# Altium footprint library MiscDevices.PcbLib: 251 footprints (part 10 of 16)
Each footprint in its own frame and in the unit in brackets; x right, y up, seen from the top. Pads: shape width x height; smd on the part's side, far side on the other; paste and mask are expansions set on the pad; w line width, h text height; cw(c..) or ccw(c..) is an arc to the next point about the centre after c.
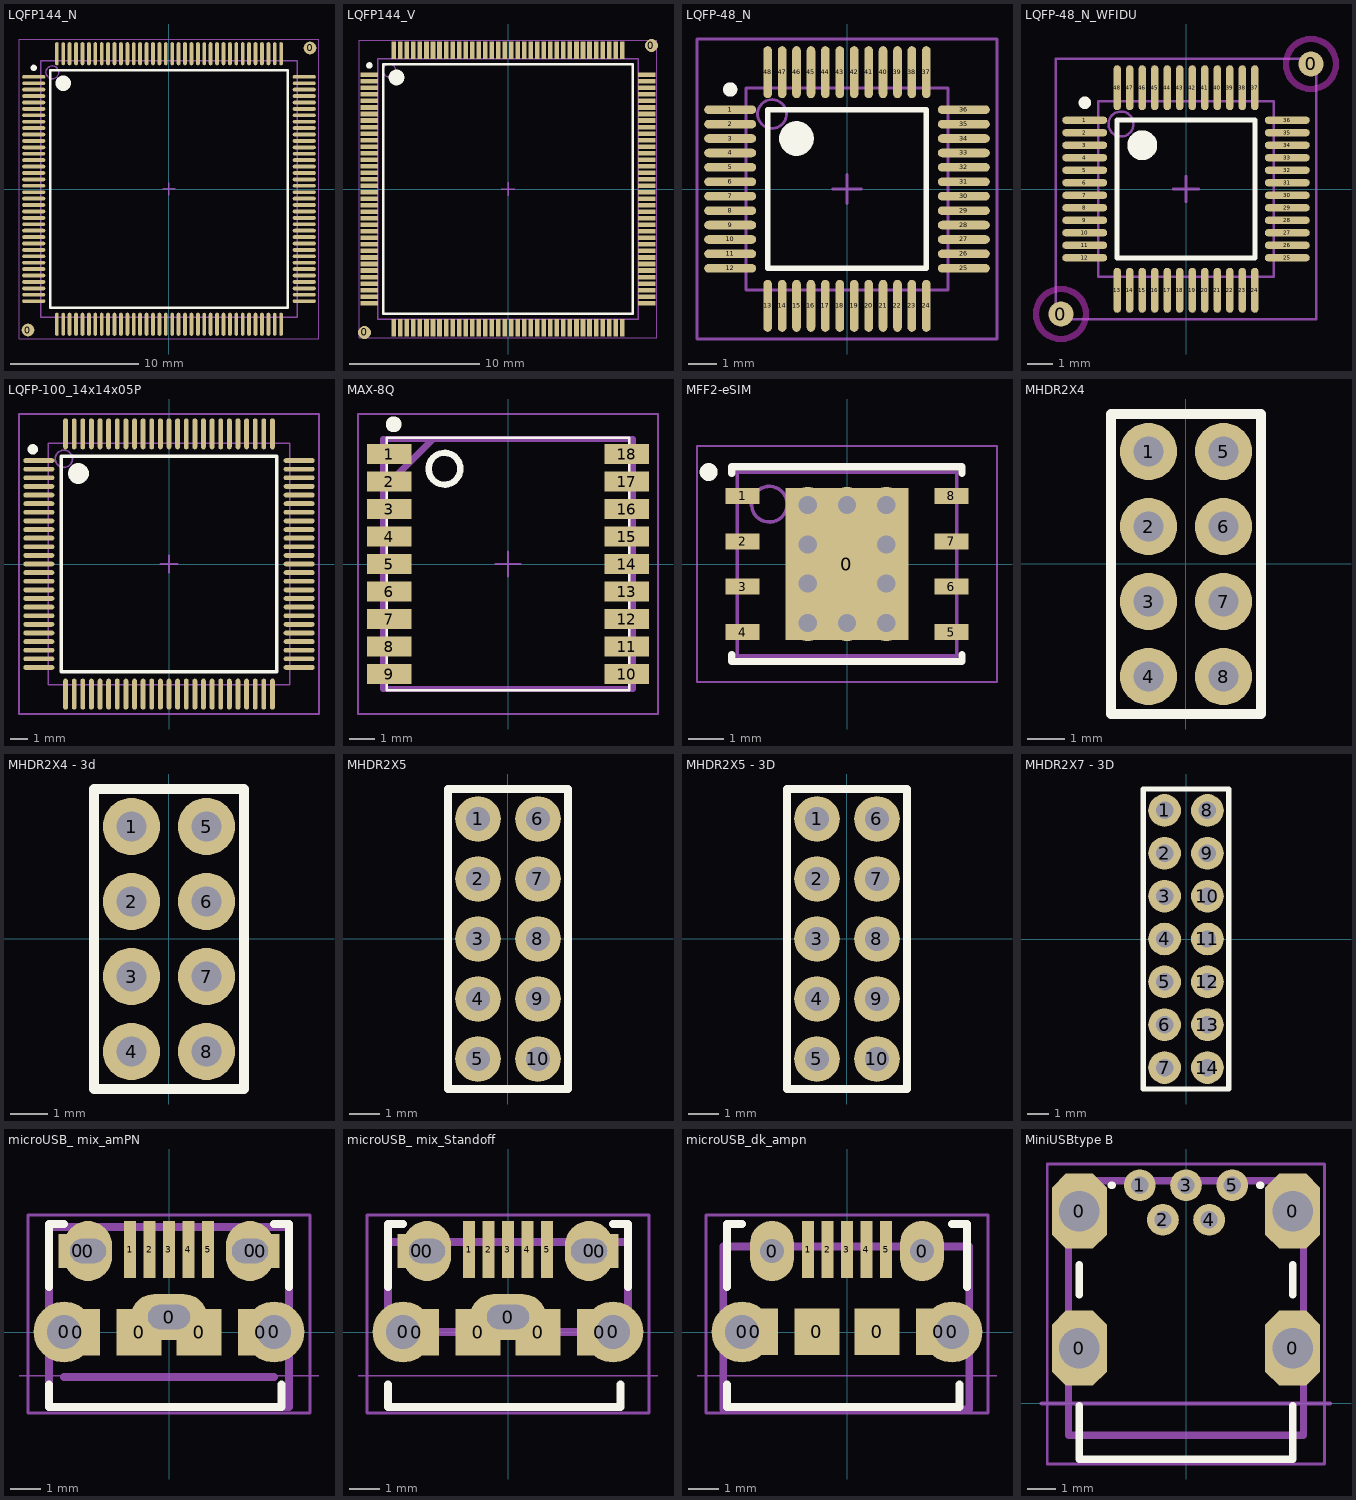
[diagram p9: the footprints below, top view; thin cyan lines are the x and y axes]

## LQFP144_N [mm] "Thin QFP, 144-Leads, Body 20x20mm, Pitch 0.5mm, IPC Medium Density"
height 1.6
pads (146):
  round 1 smd paste-10 mask+1: 0(-11,-11) 0(11,11)
  oval 1.8x0.3 smd: 1(-10.55,8.75) 2(-10.55,8.25) 3(-10.55,7.75) 4(-10.55,7.25) 5(-10.55,6.75) 6(-10.55,6.25) 7(-10.55,5.75) 8(-10.55,5.25) 9(-10.55,4.75) 10(-10.55,4.25) 11(-10.55,3.75) 12(-10.55,3.25) 13(-10.55,2.75) 14(-10.55,2.25) 15(-10.55,1.75) 16(-10.55,1.25) 17(-10.55,0.75) 18(-10.55,0.25) 19(-10.55,-0.25) 20(-10.55,-0.75) 21(-10.55,-1.25) 22(-10.55,-1.75) 23(-10.55,-2.25) 24(-10.55,-2.75) 25(-10.55,-3.25) 26(-10.55,-3.75) 27(-10.55,-4.25) 28(-10.55,-4.75) 29(-10.55,-5.25) 30(-10.55,-5.75) 31(-10.55,-6.25) 32(-10.55,-6.75) 33(-10.55,-7.25) 34(-10.55,-7.75) 35(-10.55,-8.25) 36(-10.55,-8.75) 73(10.55,-8.75) 74(10.55,-8.25) 75(10.55,-7.75) 76(10.55,-7.25) 77(10.55,-6.75) 78(10.55,-6.25) 79(10.55,-5.75) 80(10.55,-5.25) 81(10.55,-4.75) 82(10.55,-4.25) 83(10.55,-3.75) 84(10.55,-3.25) 85(10.55,-2.75) 86(10.55,-2.25) 87(10.55,-1.75) 88(10.55,-1.25) 89(10.55,-0.75) 90(10.55,-0.25) 91(10.55,0.25) 92(10.55,0.75) 93(10.55,1.25) 94(10.55,1.75) 95(10.55,2.25) 96(10.55,2.75) 97(10.55,3.25) 98(10.55,3.75) 99(10.55,4.25) 100(10.55,4.75) 101(10.55,5.25) 102(10.55,5.75) 103(10.55,6.25) 104(10.55,6.75) 105(10.55,7.25) 106(10.55,7.75) 107(10.55,8.25) 108(10.55,8.75)
  oval 0.3x1.8 smd: 37(-8.75,-10.55) 38(-8.25,-10.55) 39(-7.75,-10.55) 40(-7.25,-10.55) 41(-6.75,-10.55) 42(-6.25,-10.55) 43(-5.75,-10.55) 44(-5.25,-10.55) 45(-4.75,-10.55) 46(-4.25,-10.55) 47(-3.75,-10.55) 48(-3.25,-10.55) 49(-2.75,-10.55) 50(-2.25,-10.55) 51(-1.75,-10.55) 52(-1.25,-10.55) 53(-0.75,-10.55) 54(-0.25,-10.55) 55(0.25,-10.55) 56(0.75,-10.55) 57(1.25,-10.55) 58(1.75,-10.55) 59(2.25,-10.55) 60(2.75,-10.55) 61(3.25,-10.55) 62(3.75,-10.55) 63(4.25,-10.55) 64(4.75,-10.55) 65(5.25,-10.55) 66(5.75,-10.55) 67(6.25,-10.55) 68(6.75,-10.55) 69(7.25,-10.55) 70(7.75,-10.55) 71(8.25,-10.55) 72(8.75,-10.55) 109(8.75,10.55) 110(8.25,10.55) 111(7.75,10.55) 112(7.25,10.55) 113(6.75,10.55) 114(6.25,10.55) 115(5.75,10.55) 116(5.25,10.55) 117(4.75,10.55) 118(4.25,10.55) 119(3.75,10.55) 120(3.25,10.55) 121(2.75,10.55) 122(2.25,10.55) 123(1.75,10.55) 124(1.25,10.55) 125(0.75,10.55) 126(0.25,10.55) 127(-0.25,10.55) 128(-0.75,10.55) 129(-1.25,10.55) 130(-1.75,10.55) 131(-2.25,10.55) 132(-2.75,10.55) 133(-3.25,10.55) 134(-3.75,10.55) 135(-4.25,10.55) 136(-4.75,10.55) 137(-5.25,10.55) 138(-5.75,10.55) 139(-6.25,10.55) 140(-6.75,10.55) 141(-7.25,10.55) 142(-7.75,10.55) 143(-8.25,10.55) 144(-8.75,10.55)
Top Overlay:
  circle w0.6: c-8.25,8.25 r0.3
  circle w0.25: c-10.55,9.45 r0.125
  lines w0.2: -9.25,-9.25 9.25,-9.25 9.25,9.25 -9.25,9.25 -9.25,-9.25
Top Designator (Mech7):
  text ".Designator" at -7.618,-0.508 h1.52
Top Assembly:
  circle w0.1: c-9.1,9.1 r0.5
  lines w0.1: -10,-10 10,-10 10,10 -10,10 -10,-10
Top Courtyard:
  lines w0.05: -11.7,-11.7 11.7,-11.7 11.7,11.7 -11.7,11.7 -11.7,-11.7
  lines w0.1: -0.5,0 0.5,0 ; 0,-0.5 0,0.5
3D body "LQFP144-0_5.STEP": height 1.58, standoff 0.01, extent -10.886,-10.886 10.886,10.886

## LQFP144_V [mm] "Thin QFP, 144-Leads, Body 20x20mm, Pitch 0.5mm, ST Recommended"
height 1.6
pads (146):
  round 1 smd paste-10 mask+1: 0(-11,-11) 0(11,11)
  rect 1.35x0.35 smd: 1(-10.625,8.75) 2(-10.625,8.25) 3(-10.625,7.75) 4(-10.625,7.25) 5(-10.625,6.75) 6(-10.625,6.25) 7(-10.625,5.75) 8(-10.625,5.25) 9(-10.625,4.75) 10(-10.625,4.25) 11(-10.625,3.75) 12(-10.625,3.25) 13(-10.625,2.75) 14(-10.625,2.25) 15(-10.625,1.75) 16(-10.625,1.25) 17(-10.625,0.75) 18(-10.625,0.25) 19(-10.625,-0.25) 20(-10.625,-0.75) 21(-10.625,-1.25) 22(-10.625,-1.75) 23(-10.625,-2.25) 24(-10.625,-2.75) 25(-10.625,-3.25) 26(-10.625,-3.75) 27(-10.625,-4.25) 28(-10.625,-4.75) 29(-10.625,-5.25) 30(-10.625,-5.75) 31(-10.625,-6.25) 32(-10.625,-6.75) 33(-10.625,-7.25) 34(-10.625,-7.75) 35(-10.625,-8.25) 36(-10.625,-8.75) 73(10.625,-8.75) 74(10.625,-8.25) 75(10.625,-7.75) 76(10.625,-7.25) 77(10.625,-6.75) 78(10.625,-6.25) 79(10.625,-5.75) 80(10.625,-5.25) 81(10.625,-4.75) 82(10.625,-4.25) 83(10.625,-3.75) 84(10.625,-3.25) 85(10.625,-2.75) 86(10.625,-2.25) 87(10.625,-1.75) 88(10.625,-1.25) 89(10.625,-0.75) 90(10.625,-0.25) 91(10.625,0.25) 92(10.625,0.75) 93(10.625,1.25) 94(10.625,1.75) 95(10.625,2.25) 96(10.625,2.75) 97(10.625,3.25) 98(10.625,3.75) 99(10.625,4.25) 100(10.625,4.75) 101(10.625,5.25) 102(10.625,5.75) 103(10.625,6.25) 104(10.625,6.75) 105(10.625,7.25) 106(10.625,7.75) 107(10.625,8.25) 108(10.625,8.75)
  rect 0.35x1.35 smd: 37(-8.75,-10.625) 38(-8.25,-10.625) 39(-7.75,-10.625) 40(-7.25,-10.625) 41(-6.75,-10.625) 42(-6.25,-10.625) 43(-5.75,-10.625) 44(-5.25,-10.625) 45(-4.75,-10.625) 46(-4.25,-10.625) 47(-3.75,-10.625) 48(-3.25,-10.625) 49(-2.75,-10.625) 50(-2.25,-10.625) 51(-1.75,-10.625) 52(-1.25,-10.625) 53(-0.75,-10.625) 54(-0.25,-10.625) 55(0.25,-10.625) 56(0.75,-10.625) 57(1.25,-10.625) 58(1.75,-10.625) 59(2.25,-10.625) 60(2.75,-10.625) 61(3.25,-10.625) 62(3.75,-10.625) 63(4.25,-10.625) 64(4.75,-10.625) 65(5.25,-10.625) 66(5.75,-10.625) 67(6.25,-10.625) 68(6.75,-10.625) 69(7.25,-10.625) 70(7.75,-10.625) 71(8.25,-10.625) 72(8.75,-10.625) 109(8.75,10.625) 110(8.25,10.625) 111(7.75,10.625) 112(7.25,10.625) 113(6.75,10.625) 114(6.25,10.625) 115(5.75,10.625) 116(5.25,10.625) 117(4.75,10.625) 118(4.25,10.625) 119(3.75,10.625) 120(3.25,10.625) 121(2.75,10.625) 122(2.25,10.625) 123(1.75,10.625) 124(1.25,10.625) 125(0.75,10.625) 126(0.25,10.625) 127(-0.25,10.625) 128(-0.75,10.625) 129(-1.25,10.625) 130(-1.75,10.625) 131(-2.25,10.625) 132(-2.75,10.625) 133(-3.25,10.625) 134(-3.75,10.625) 135(-4.25,10.625) 136(-4.75,10.625) 137(-5.25,10.625) 138(-5.75,10.625) 139(-6.25,10.625) 140(-6.75,10.625) 141(-7.25,10.625) 142(-7.75,10.625) 143(-8.25,10.625) 144(-8.75,10.625)
Top Overlay:
  circle w0.25: c-10.625,9.475 r0.125
  circle w0.6: c-8.55,8.55 r0.3
  lines w0.2: -9.55,-9.55 -9.55,9.55 9.55,9.55 9.55,-9.55 -9.55,-9.55
Top Designator (Mech7):
  text ".Designator" at -7.618,-0.508 h1.52
Top Assembly:
  circle w0.1: c-9.1,9.1 r0.5
  lines w0.1: -10,-10 -10,10 10,10 10,-10 -10,-10
Top Courtyard:
  lines w0.05: -11.4,-11.4 -11.4,11.4 11.4,11.4 11.4,-11.4 -11.4,-11.4
  lines w0.1: -0.5,0 0.5,0 ; 0,-0.5 0,0.5
3D body "LQFP144-0_5.STEP": height 1.58, standoff 0.01, extent -10.886,-10.886 10.886,10.886

## LQFP-48_N [mm] "Thin QFP, 48-Leads, Body 7x7mm, Pitch 0.5mm, IPC Medium Density"
height 1.6
pads (48):
  oval 1.8x0.3 smd: 1(-4.05,2.75) 2(-4.05,2.25) 3(-4.05,1.75) 4(-4.05,1.25) 5(-4.05,0.75) 6(-4.05,0.25) 7(-4.05,-0.25) 8(-4.05,-0.75) 9(-4.05,-1.25) 10(-4.05,-1.75) 11(-4.05,-2.25) 12(-4.05,-2.75) 25(4.05,-2.75) 26(4.05,-2.25) 27(4.05,-1.75) 28(4.05,-1.25) 29(4.05,-0.75) 30(4.05,-0.25) 31(4.05,0.25) 32(4.05,0.75) 33(4.05,1.25) 34(4.05,1.75) 35(4.05,2.25) 36(4.05,2.75)
  oval 0.3x1.8 smd: 13(-2.75,-4.05) 14(-2.25,-4.05) 15(-1.75,-4.05) 16(-1.25,-4.05) 17(-0.75,-4.05) 18(-0.25,-4.05) 19(0.25,-4.05) 20(0.75,-4.05) 21(1.25,-4.05) 22(1.75,-4.05) 23(2.25,-4.05) 24(2.75,-4.05) 37(2.75,4.05) 38(2.25,4.05) 39(1.75,4.05) 40(1.25,4.05) 41(0.75,4.05) 42(0.25,4.05) 43(-0.25,4.05) 44(-0.75,4.05) 45(-1.25,4.05) 46(-1.75,4.05) 47(-2.25,4.05) 48(-2.75,4.05)
Top Overlay:
  circle w0.6: c-1.75,1.75 r0.3
  circle w0.25: c-4.05,3.45 r0.125
  lines w0.2: -2.75,-2.75 2.75,-2.75 2.75,2.75 -2.75,2.75 -2.75,-2.75
Top Designator (Mech7):
  text ".Designator" at -7.618,-0.508 h1.52
Top Assembly:
  circle w0.1: c-2.6,2.6 r0.5
  lines w0.1: -3.5,-3.5 3.5,-3.5 3.5,3.5 -3.5,3.5 -3.5,-3.5
Top Courtyard:
  lines w0.1: -0.5,0 0.5,0 ; 0,-0.5 0,0.5 ; -5.2,-5.2 5.2,-5.2 5.2,5.2 -5.2,5.2 -5.2,-5.2
3D body "SW3dPS-P-LQFP48-7x7-0.50.STEP": height 1.46, standoff 0.01, extent -4.5,-4.5 4.5,4.5

## LQFP-48_N_WFIDU [mm] "Thin QFP, 48-Leads, Body 7x7mm, Pitch 0.5mm, IPC Medium Density"
height 1.6
pads (50):
  round 1 smd paste-10 mask+0.5: 0(-5,-5) 0(5,5)
  oval 1.8x0.3 smd: 1(-4.05,2.75) 2(-4.05,2.25) 3(-4.05,1.75) 4(-4.05,1.25) 5(-4.05,0.75) 6(-4.05,0.25) 7(-4.05,-0.25) 8(-4.05,-0.75) 9(-4.05,-1.25) 10(-4.05,-1.75) 11(-4.05,-2.25) 12(-4.05,-2.75) 25(4.05,-2.75) 26(4.05,-2.25) 27(4.05,-1.75) 28(4.05,-1.25) 29(4.05,-0.75) 30(4.05,-0.25) 31(4.05,0.25) 32(4.05,0.75) 33(4.05,1.25) 34(4.05,1.75) 35(4.05,2.25) 36(4.05,2.75)
  oval 0.3x1.8 smd: 13(-2.75,-4.05) 14(-2.25,-4.05) 15(-1.75,-4.05) 16(-1.25,-4.05) 17(-0.75,-4.05) 18(-0.25,-4.05) 19(0.25,-4.05) 20(0.75,-4.05) 21(1.25,-4.05) 22(1.75,-4.05) 23(2.25,-4.05) 24(2.75,-4.05) 37(2.75,4.05) 38(2.25,4.05) 39(1.75,4.05) 40(1.25,4.05) 41(0.75,4.05) 42(0.25,4.05) 43(-0.25,4.05) 44(-0.75,4.05) 45(-1.25,4.05) 46(-1.75,4.05) 47(-2.25,4.05) 48(-2.75,4.05)
Top Layer keep-out:
  lines w0.254: -4,-5 ccw(c-5,-5) -4,-5 ; 6,5 ccw(c5,5) 6,5
Top Overlay:
  circle w0.6: c-1.75,1.75 r0.3
  circle w0.25: c-4.05,3.45 r0.125
  lines w0.2: -2.75,-2.75 2.75,-2.75 2.75,2.75 -2.75,2.75 -2.75,-2.75
Top Designator (Mech7):
  text ".Designator" at -7.618,-0.508 h1.52
Top Assembly:
  circle w0.1: c-2.6,2.6 r0.5
  lines w0.1: -3.5,-3.5 3.5,-3.5 3.5,3.5 -3.5,3.5 -3.5,-3.5
Top Courtyard:
  lines w0.1: -0.5,0 0.5,0 ; 0,-0.5 0,0.5 ; -5.2,-5.2 5.2,-5.2 5.2,5.2 -5.2,5.2 -5.2,-5.2
3D body "SW3dPS-P-LQFP48-7x7-0.50.STEP": height 1.46, standoff 0.01, extent -4.5,-4.5 4.5,4.5

## LQFP-100_14x14x05P [mm]
pads (100):
  oval 1.8x0.28 smd mask+0.051: 1(-7.55,6) 2(-7.55,5.5) 3(-7.55,5) 4(-7.55,4.5) 5(-7.55,4) 6(-7.55,3.5) 7(-7.55,3) 8(-7.55,2.5) 9(-7.55,2) 10(-7.55,1.5) 11(-7.55,1) 12(-7.55,0.5) 13(-7.55,0) 14(-7.55,-0.5) 15(-7.55,-1) 16(-7.55,-1.5) 17(-7.55,-2) 18(-7.55,-2.5) 19(-7.55,-3) 20(-7.55,-3.5) 21(-7.55,-4) 22(-7.55,-4.5) 23(-7.55,-5) 24(-7.55,-5.5) 25(-7.55,-6) 51(7.55,-6) 52(7.55,-5.5) 53(7.55,-5) 54(7.55,-4.5) 55(7.55,-4) 56(7.55,-3.5) 57(7.55,-3) 58(7.55,-2.5) 59(7.55,-2) 60(7.55,-1.5) 61(7.55,-1) 62(7.55,-0.5) 63(7.55,0) 64(7.55,0.5) 65(7.55,1) 66(7.55,1.5) 67(7.55,2) 68(7.55,2.5) 69(7.55,3) 70(7.55,3.5) 71(7.55,4) 72(7.55,4.5) 73(7.55,5) 74(7.55,5.5) 75(7.55,6)
  oval 0.28x1.8 smd mask+0.051: 26(-6,-7.55) 27(-5.5,-7.55) 28(-5,-7.55) 29(-4.5,-7.55) 30(-4,-7.55) 31(-3.5,-7.55) 32(-3,-7.55) 33(-2.5,-7.55) 34(-2,-7.55) 35(-1.5,-7.55) 36(-1,-7.55) 37(-0.5,-7.55) 38(0,-7.55) 39(0.5,-7.55) 40(1,-7.55) 41(1.5,-7.55) 42(2,-7.55) 43(2.5,-7.55) 44(3,-7.55) 45(3.5,-7.55) 46(4,-7.55) 47(4.5,-7.55) 48(5,-7.55) 49(5.5,-7.55) 50(6,-7.55) 76(6,7.55) 77(5.5,7.55) 78(5,7.55) 79(4.5,7.55) 80(4,7.55) 81(3.5,7.55) 82(3,7.55) 83(2.5,7.55) 84(2,7.55) 85(1.5,7.55) 86(1,7.55) 87(0.5,7.55) 88(0,7.55) 89(-0.5,7.55) 90(-1,7.55) 91(-1.5,7.55) 92(-2,7.55) 93(-2.5,7.55) 94(-3,7.55) 95(-3.5,7.55) 96(-4,7.55) 97(-4.5,7.55) 98(-5,7.55) 99(-5.5,7.55) 100(-6,7.55)
Top Overlay:
  circle w0.3: c-7.9,6.65 r0.15
  circle w0.6: c-5.25,5.25 r0.3
  lines w0.2: -6.25,-6.25 -6.25,6.25 6.25,6.25 6.25,-6.25 -6.25,-6.25
Top Designator (Mech7):
  text ".Designator" at -7.618,-0.508 h1.52
Top Assembly:
  circle w0.1: c-6.1,6.1 r0.5
  lines w0.1: -7,-7 -7,7 7,7 7,-7 -7,-7
Top Courtyard:
  lines w0.1: -0.5,0 0.5,0 ; 0,-0.5 0,0.5 ; -8.7,-8.7 8.7,-8.7 8.7,8.7 -8.7,8.7 -8.7,-8.7
3D body "LQFP-100.STEP": height 1.6, standoff 0, extent -8,-8 8,8

## MAX-8Q [mm] "MAX-8Q U-Blox GNSS"
pads (18):
  rect 1.8x0.8 smd: 1(-4.75,4.4) 2(-4.75,3.3) 3(-4.75,2.2) 4(-4.75,1.1) 5(-4.75,0) 6(-4.75,-1.1) 7(-4.75,-2.2) 8(-4.75,-3.3) 9(-4.75,-4.4) 10(4.75,-4.4) 11(4.75,-3.3) 12(4.75,-2.2) 13(4.75,-1.1) 14(4.75,0) 15(4.75,1.1) 16(4.75,2.2) 17(4.75,3.3) 18(4.75,4.4)
Top Overlay:
  circle w0.381: c-4.572,5.588 r0.127
  circle w0.254: c-2.54,3.81 r0.635
  lines w0.1: -4.85,-5.05 -4.85,5.05 4.85,5.05 4.85,-5.05 -4.85,-5.05
Top Designator (Mech7):
  text ".Designator" at -7.618,-0.508 h1.52
Top Assembly:
  lines w0.254: -5,3 -3,5 ; -5,-5 5,-5 5,5 -5,5 -5,-5
Top Courtyard:
  lines w0.1: -0.5,0 0.5,0 ; 0,-0.5 0,0.5 ; -6,-6 6,-6 6,6 -6,6 -6,-6
3D body "MAX (STEP-AP214).STEP": height 2.47, standoff 0, extent -4.85,-5.05 4.85,5.05

## MFF2-eSIM [mm] "QFN, 8-Leads, Body 6.08x5.08mm, Pitch 1.27mm, Thermal Pad 3.45x4.25mm, IPC Medium Density"
height 0.9
pads (17):
  rect 3.45x4.25 smd: 0(0,0)
  rect 0.95x0.45 smd: 1(-2.925,1.905) 2(-2.925,0.635) 3(-2.925,-0.635) 4(-2.925,-1.905) 5(2.925,-1.905) 6(2.925,-0.635) 7(2.925,0.635) 8(2.925,1.905)
  rect 0x0 smd: 9(-0.85,0) 10(-0.35,0) 11(0,0.85) 12(0,0.35) 13(0.85,0) 14(0.35,0) 15(0,-0.85) 16(0,-0.35)
via -1.1,1.65 diameter 1.016 hole 0.508
via 0,1.65 diameter 1.016 hole 0.508
via 1.1,1.65 diameter 1.016 hole 0.508
via -1.1,0.55 diameter 1.016 hole 0.508
via 1.1,0.55 diameter 1.016 hole 0.508
via -1.1,-0.55 diameter 1.016 hole 0.508
via 1.1,-0.55 diameter 1.016 hole 0.508
via -1.1,-1.65 diameter 1.016 hole 0.508
via 0,-1.65 diameter 1.016 hole 0.508
via 1.1,-1.65 diameter 1.016 hole 0.508
Top Overlay:
  circle w0.25: c-3.875,2.575 r0.125
  lines w0.2: -3.225,-2.53 -3.225,-2.725 0.01,-2.725 ; -3.225,2.53 -3.225,2.725 0.01,2.725 ; -0.01,-2.725 3.225,-2.725 3.225,-2.53 ; -0.01,2.725 3.225,2.725 3.225,2.53
Top Designator (Mech7):
  text ".Designator" at -7.618,-0.508 h1.52
Top Assembly:
  circle w0.1: c-2.175,1.675 r0.5
  lines w0.1: -3.075,-2.575 -3.075,2.575 3.075,2.575 3.075,-2.575 -3.075,-2.575
Top Courtyard:
  lines w0.05: -4.2,-3.3 -4.2,3.3 4.2,3.3 4.2,-3.3 -4.2,-3.3
  lines w0.1: -0.5,0 0.5,0 ; 0,-0.5 0,0.5
3D body "eSIM_MFF2.SLDPRT": height 1.15, standoff 0, extent -3,-3.25 3,3.25

## MHDR2X4 [mil] "HDR2X4 , 2.00mm pitch"
height 118.11
pads (8):
  round 60 hole 32: 1(-39.37,118.11) 2(-39.37,39.37) 3(-39.37,-39.37) 4(-39.37,-118.11) 5(39.37,118.11) 6(39.37,39.37) 7(39.37,-39.37) 8(39.37,-118.11)
Top Overlay:
  lines w10: -78.74,-157.48 78.74,-157.48 78.74,157.48 -78.74,157.48 -78.74,-157.48
Top Designator (Mech7):
  text ".Designator" at -299.9,-19.99 h60

## MHDR2X4 - 3d [mil] "HDR2X4 , 2.00mm pitch"
height 118.11
pads (8):
  round 60 hole 32: 1(-39.37,118.11) 2(-39.37,39.37) 3(-39.37,-39.37) 4(-39.37,-118.11) 5(39.37,118.11) 6(39.37,39.37) 7(39.37,-39.37) 8(39.37,-118.11)
Top Overlay:
  lines w10: -78.74,-157.48 -78.74,157.48 78.74,157.48 78.74,-157.48 -78.74,-157.48
Top Designator (Mech7):
  text ".Designator" at -299.9,-19.99 h60
3D body "mHDR4x2.SLDPRT": height 236.22, standoff -78.74, extent -78.74,-157.48 78.74,157.48

## MHDR2X5 [mil] "HDR2X5 , 2.00mm pitch"
height 118.11
pads (10):
  round 60 hole 32: 1(-39.37,157.48) 2(-39.37,78.74) 3(-39.37,0) 4(-39.37,-78.74) 5(-39.37,-157.48) 6(39.37,157.48) 7(39.37,78.74) 8(39.37,0) 9(39.37,-78.74) 10(39.37,-157.48)
Top Overlay:
  lines w10: -78.74,-196.85 -78.74,196.85 78.74,196.85 78.74,-196.85 -78.74,-196.85
Top Designator (Mech7):
  text ".Designator" at -299.9,-19.99 h60

## MHDR2X5 - 3D [mil] "HDR2X5 , 2.00mm pitch"
height 118.11
pads (10):
  round 60 hole 32: 1(-39.37,157.48) 2(-39.37,78.74) 3(-39.37,0) 4(-39.37,-78.74) 5(-39.37,-157.48) 6(39.37,157.48) 7(39.37,78.74) 8(39.37,0) 9(39.37,-78.74) 10(39.37,-157.48)
Top Overlay:
  lines w10: -78.74,-196.85 -78.74,196.85 78.74,196.85 78.74,-196.85 -78.74,-196.85
Top Designator (Mech7):
  text ".Designator" at -299.9,-19.99 h60
3D body "MHDR2x5.STEP": height 236.22, standoff -110.24, extent -78.74,-196.85 78.74,196.85

## MHDR2X7 - 3D [mil] "HDR2X7 , 2.00mm pitch"
height 236.22
pads (14):
  round 60 hole 32: 1(-39.37,236.22) 2(-39.37,157.48) 3(-39.37,78.74) 4(-39.37,0) 5(-39.37,-78.74) 6(-39.37,-157.48) 7(-39.37,-236.22) 8(39.37,236.22) 9(39.37,157.48) 10(39.37,78.74) 11(39.37,0) 12(39.37,-78.74) 13(39.37,-157.48) 14(39.37,-236.22)
Top Overlay:
  lines w10: -78.74,-275.59 78.74,-275.59 78.74,275.59 -78.74,275.59 -78.74,-275.59
Top Designator (Mech7):
  text ".Designator" at -299.9,-19.99 h60
3D body "MHDR2x7.SLDPRT": height 236.22, standoff -110.24, extent -78.74,-275.59 78.74,275.59

## microUSB_ mix_amPN [mm]
height 2.5
pads (16):
  round 2.032 hole 1.118: 0(-3.5,0) 0(3.5,0)
  rect 1.5x1.55 smd: 0(-3.05,0) 0(-1,0) 0(1,0) 0(3.05,0)
  rect 1.27x1.143 smd: 0(-3.05,2.7) 0(3.05,2.7)
  oval 1.6x2 hole 0.813 slot 1.2 at 0 deg: 0(-2.7,2.7) 0(2.7,2.7)
  oval 2.54x1.524 hole 0.813 slot 1.4 at 0 deg: 0(0,0.5)
  rect 0.4x1.9 smd: 1(-1.3,2.75) 2(-0.65,2.75) 3(0,2.75) 4(0.65,2.75) 5(1.3,2.75)
Top Overlay:
  lines w0.254: -4,-1.75 -4,-2.5 3.75,-2.5 3.75,-1.75 ; -4,1.5 -4,3.6 -3.5,3.6 ; 3.5,3.6 4,3.6 4,1.5
Top Designator (Mech7):
  text ".Designator" at -7.618,-0.508 h1.52
Top Assembly:
  lines w0.254: -3.5,-1.5 3.5,-1.5 ; -4,-2.5 4,-2.5 4,3.5 -4,3.5 -4,-2.5
Top Courtyard:
  lines w0.05: -5,-1.45 5,-1.45
  lines w0.1: -4.7,-2.7 4.7,-2.7 4.7,3.9 -4.7,3.9 -4.7,-2.7
  text "BOARD EDGE" at -2.5,-2.25 h0.5
3D body "User Library-MicroUSB-B_Molex_105017-0001.STEP": height 2.68, standoff -0.63, extent -4.1,-2.58 4.1,2.85

## microUSB_ mix_Standoff [mm]
height 2.5
pads (16):
  round 2.032 hole 1.118: 0(-3.5,0) 0(3.5,0)
  rect 1.5x1.55 smd: 0(-3.05,0) 0(-1,0) 0(1,0) 0(3.05,0)
  rect 1.27x1.143 smd: 0(-3.05,2.7) 0(3.05,2.7)
  oval 1.6x2 hole 0.813 slot 1.2 at 0 deg: 0(-2.7,2.7) 0(2.7,2.7)
  oval 2.54x1.524 hole 0.813 slot 1.4 at 0 deg: 0(0,0.5)
  rect 0.4x1.9 smd: 1(-1.3,2.75) 2(-0.65,2.75) 3(0,2.75) 4(0.65,2.75) 5(1.3,2.75)
Top Overlay:
  lines w0.254: -4,-1.75 -4,-2.5 3.75,-2.5 3.75,-1.75 ; -4,1.5 -4,3.6 -3.5,3.6 ; 3.5,3.6 4,3.6 4,1.5
Top Designator (Mech7):
  text ".Designator" at -7.618,-0.508 h1.52
Top Assembly:
  lines w0.254: -4,0 -4,3 4,3 4,0 -4,0
Top Courtyard:
  lines w0.05: -5,-1.45 5,-1.45
  lines w0.1: -4.7,-2.7 -4.7,3.9 4.7,3.9 4.7,-2.7 -4.7,-2.7
  text "BOARD EDGE" at -2.5,-2.25 h0.5
3D body "User Library-Micro USB B 1051330011.SLDPRT": height 6.69, standoff -2.32, extent -4.025,0.118 3.975,3.133

## microUSB_dk_ampn [mm]
height 2.5
pads (13):
  round 2.032 hole 1.118: 0(-3.5,0) 0(3.5,0)
  rect 1.5x1.55 smd: 0(-3.05,0) 0(-1,0) 0(1,0) 0(3.05,0)
  oval 1.46x2 hole 0.813: 0(-2.5,2.7) 0(2.5,2.7)
  rect 0.4x1.9 smd: 1(-1.3,2.75) 2(-0.65,2.75) 3(0,2.75) 4(0.65,2.75) 5(1.3,2.75)
Top Overlay:
  lines w0.254: -4,-1.75 -4,-2.5 3.75,-2.5 3.75,-1.75 ; -4,1.5 -4,3.6 -3.5,3.6 ; 3.5,3.6 4,3.6 4,1.5
Top Designator (Mech7):
  text ".Designator" at -7.618,-0.508 h1.52
Top Assembly:
  lines w0.254: -4.125,-2.58 4.075,-2.58 4.075,2.85 -4.125,2.85 -4.125,-2.58
Top Courtyard:
  lines w0.05: -5,-1.45 5,-1.45
  lines w0.1: -4.7,-2.7 -4.7,3.9 4.7,3.9 4.7,-2.7 -4.7,-2.7
  text "BOARD EDGE" at -2.5,-2.25 h0.5
3D body "User Library-MicroUSB-B_Molex_105017-0001.STEP": height 2.68, standoff -0.63, extent -4.125,-2.58 4.075,2.85

## MiniUSBtype B [mm]
pads (9):
  oct 1.908x2.6 hole 1.4: 0(-3.7,1.915) 0(-3.7,6.665) 0(3.7,1.915) 0(3.7,6.665)
  round 1.1 hole 0.6: 1(-1.6,7.565) 2(-0.8,6.365) 3(0,7.565) 4(0.8,6.365) 5(1.6,7.565)
Top Overlay:
  lines w0.254: -3.7,-0.08 -3.7,-1.935 3.7,-1.935 3.7,-0.08 ; -3.7,3.77 -3.7,4.81 ; -2.6,7.565 -2.56,7.565 ; 2.56,7.565 2.6,7.565 ; 3.7,3.77 3.7,4.81
Top Designator (Mech7):
  text ".Designator" at -7.618,2.492 h1.52
Top Assembly:
  lines w0.254: -4.075,-1.1 -4.075,7.725 4.075,7.725 4.075,-1.1 -4.075,-1.1
Top Courtyard:
  lines w0.1: -4.81,-2.1 -4.81,8.3 ; -4.8,-2.1 4.8,-2.1 4.8,8.3 -4.8,8.3
  lines w0.15: -5,0 4.99,0
  text "pcb edge" at -3.55,-1.55 h0.9
3D body "71071440.stp": height 3.91, standoff -2.59, extent -4.075,-1.1 4.075,7.725